# Altium footprint library 常用元件封装库.PcbLib: 1310 footprints (part 74 of 83)
Each footprint in its own frame and in the unit in brackets; x right, y up, seen from the top. Pads: shape width x height; smd on the part's side, far side on the other; paste and mask are expansions set on the pad; w line width, h text height; cw(c..) or ccw(c..) is an arc to the next point about the centre after c.
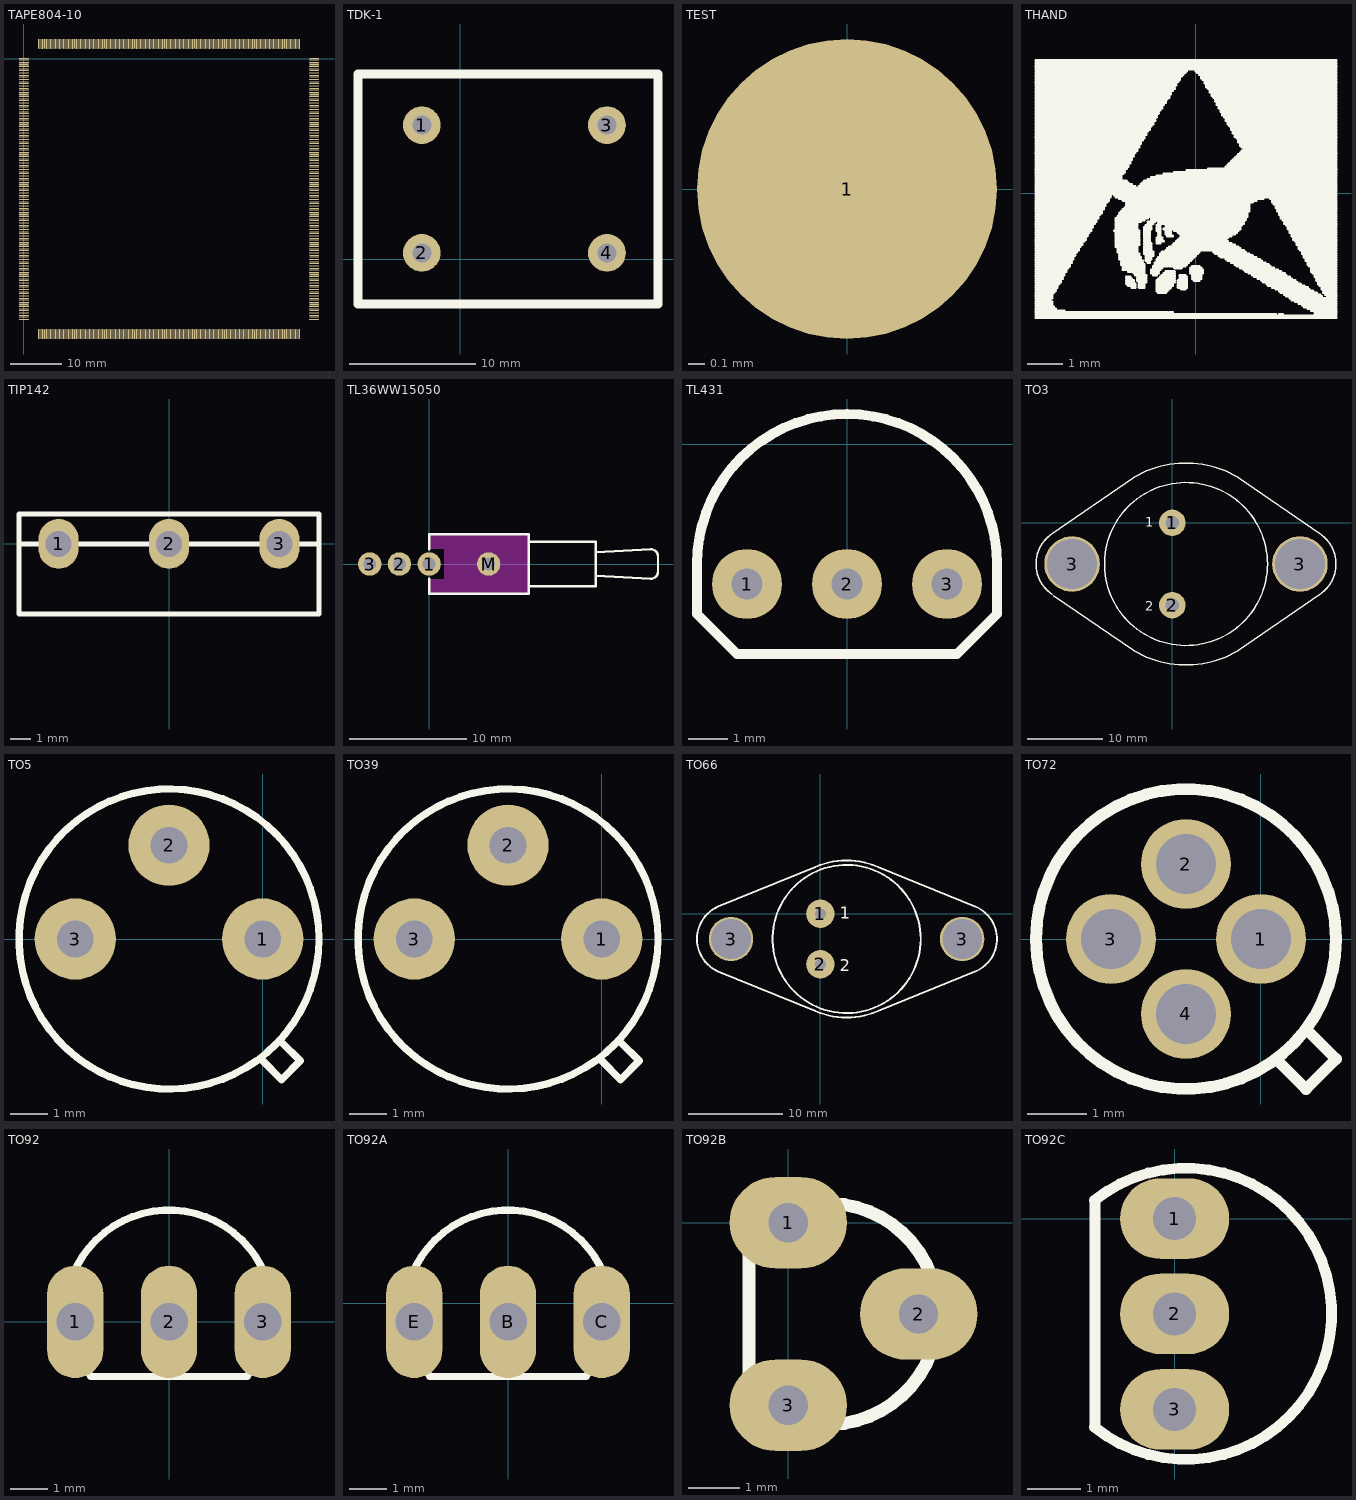
[diagram p73: the footprints below, top view; thin cyan lines are the x and y axes]

## TAPE804-10 [mil]
pads (804):
  oval 75x5 smd: 1(0,0) 2(0,-10) 3(0,-20) 4(0,-30) 5(0,-40) 6(0,-50) 7(0,-60) 8(0,-70) 9(0,-80) 10(0,-90) 11(0,-100) 12(0,-110) 13(0,-120) 14(0,-130) 15(0,-140) 16(0,-150) 17(0,-160) 18(0,-170) 19(0,-180) 20(0,-190) 21(0,-200) 22(0,-210) 23(0,-220) 24(0,-230) 25(0,-240) 26(0,-250) 27(0,-260) 28(0,-270) 29(0,-280) 30(0,-290) 31(0,-300) 32(0,-310) 33(0,-320) 34(0,-330) 35(0,-340) 36(0,-350) 37(0,-360) 38(0,-370) 39(0,-380) 40(0,-390) 41(0,-400) 42(0,-410) 43(0,-420) 44(0,-430) 45(0,-440) 46(0,-450) 47(0,-460) 48(0,-470) 49(0,-480) 50(0,-490) 51(0,-500) 52(0,-510) 53(0,-520) 54(0,-530) 55(0,-540) 56(0,-550) 57(0,-560) 58(0,-570) 59(0,-580) 60(0,-590) 61(0,-600) 62(0,-610) 63(0,-620) 64(0,-630) 65(0,-640) 66(0,-650) 67(0,-660) 68(0,-670) 69(0,-680) 70(0,-690) 71(0,-700) 72(0,-710) 73(0,-720) 74(0,-730) 75(0,-740) 76(0,-750) 77(0,-760) 78(0,-770) 79(0,-780) 80(0,-790) 81(0,-800) 82(0,-810) 83(0,-820) 84(0,-830) 85(0,-840) 86(0,-850) 87(0,-860) 88(0,-870) 89(0,-880) 90(0,-890) 91(0,-900) 92(0,-910) 93(0,-920) 94(0,-930) 95(0,-940) 96(0,-950) 97(0,-960) 98(0,-970) 99(0,-980) 100(0,-990) 101(0,-1000) 102(0,-1010) 103(0,-1020) 104(0,-1030) 105(0,-1040) 106(0,-1050) 107(0,-1060) 108(0,-1070) 109(0,-1080) 110(0,-1090) 111(0,-1100) 112(0,-1110) 113(0,-1120) 114(0,-1130) 115(0,-1140) 116(0,-1150) 117(0,-1160) 118(0,-1170) 119(0,-1180) 120(0,-1190) 121(0,-1200) 122(0,-1210) 123(0,-1220) 124(0,-1230) 125(0,-1240) 126(0,-1250) 127(0,-1260) 128(0,-1270) 129(0,-1280) 130(0,-1290) 131(0,-1300) 132(0,-1310) 133(0,-1320) 134(0,-1330) 135(0,-1340) 136(0,-1350) 137(0,-1360) 138(0,-1370) 139(0,-1380) 140(0,-1390) 141(0,-1400) 142(0,-1410) 143(0,-1420) 144(0,-1430) 145(0,-1440) 146(0,-1450) 147(0,-1460) 148(0,-1470) 149(0,-1480) 150(0,-1490) 151(0,-1500) 152(0,-1510) 153(0,-1520) 154(0,-1530) 155(0,-1540) 156(0,-1550) 157(0,-1560) 158(0,-1570) 159(0,-1580) 160(0,-1590) 161(0,-1600) 162(0,-1610) 163(0,-1620) 164(0,-1630) 165(0,-1640) 166(0,-1650) 167(0,-1660) 168(0,-1670) 169(0,-1680) 170(0,-1690) 171(0,-1700) 172(0,-1710) 173(0,-1720) 174(0,-1730) 175(0,-1740) 176(0,-1750) 177(0,-1760) 178(0,-1770) 179(0,-1780) 180(0,-1790) 181(0,-1800) 182(0,-1810) 183(0,-1820) 184(0,-1830) 185(0,-1840) 186(0,-1850) 187(0,-1860) 188(0,-1870) 189(0,-1880) 190(0,-1890) 191(0,-1900) 192(0,-1910) 193(0,-1920) 194(0,-1930) 195(0,-1940) 196(0,-1950) 197(0,-1960) 198(0,-1970) 199(0,-1980) 200(0,-1990) 201(0,-2000) 403(2225,-2000) 404(2225,-1990) 405(2225,-1980) 406(2225,-1970) 407(2225,-1960) 408(2225,-1950) 409(2225,-1940) 410(2225,-1930) 411(2225,-1920) 412(2225,-1910) 413(2225,-1900) 414(2225,-1890) 415(2225,-1880) 416(2225,-1870) 417(2225,-1860) 418(2225,-1850) 419(2225,-1840) 420(2225,-1830) 421(2225,-1820) 422(2225,-1810) 423(2225,-1800) 424(2225,-1790) 425(2225,-1780) 426(2225,-1770) 427(2225,-1760) 428(2225,-1750) 429(2225,-1740) 430(2225,-1730) 431(2225,-1720) 432(2225,-1710) 433(2225,-1700) 434(2225,-1690) 435(2225,-1680) 436(2225,-1670) 437(2225,-1660) 438(2225,-1650) 439(2225,-1640) 440(2225,-1630) 441(2225,-1620) 442(2225,-1610) 443(2225,-1600) 444(2225,-1590) 445(2225,-1580) 446(2225,-1570) 447(2225,-1560) 448(2225,-1550) 449(2225,-1540) 450(2225,-1530) 451(2225,-1520) 452(2225,-1510) 453(2225,-1500) 454(2225,-1490) 455(2225,-1480) 456(2225,-1470) 457(2225,-1460) 458(2225,-1450) 459(2225,-1440) 460(2225,-1430) 461(2225,-1420) 462(2225,-1410) 463(2225,-1400) 464(2225,-1390) 465(2225,-1380) 466(2225,-1370) 467(2225,-1360) 468(2225,-1350) 469(2225,-1340) 470(2225,-1330) 471(2225,-1320) 472(2225,-1310) 473(2225,-1300) 474(2225,-1290) 475(2225,-1280) 476(2225,-1270) 477(2225,-1260) 478(2225,-1250) 479(2225,-1240) 480(2225,-1230) 481(2225,-1220) 482(2225,-1210) 483(2225,-1200) 484(2225,-1190) 485(2225,-1180) 486(2225,-1170) 487(2225,-1160) 488(2225,-1150) 489(2225,-1140) 490(2225,-1130) 491(2225,-1120) 492(2225,-1110) 493(2225,-1100) 494(2225,-1090) 495(2225,-1080) 496(2225,-1070) 497(2225,-1060) 498(2225,-1050) 499(2225,-1040) 500(2225,-1030) 501(2225,-1020) 502(2225,-1010) 503(2225,-1000) 504(2225,-990) 505(2225,-980) 506(2225,-970) 507(2225,-960) 508(2225,-950) 509(2225,-940) 510(2225,-930) 511(2225,-920) 512(2225,-910) 513(2225,-900) 514(2225,-890) 515(2225,-880) 516(2225,-870) 517(2225,-860) 518(2225,-850) 519(2225,-840) 520(2225,-830) 521(2225,-820) 522(2225,-810) 523(2225,-800) 524(2225,-790) 525(2225,-780) 526(2225,-770) 527(2225,-760) 528(2225,-750) 529(2225,-740) 530(2225,-730) 531(2225,-720) 532(2225,-710) 533(2225,-700) 534(2225,-690) 535(2225,-680) 536(2225,-670) 537(2225,-660) 538(2225,-650) 539(2225,-640) 540(2225,-630) 541(2225,-620) 542(2225,-610) 543(2225,-600) 544(2225,-590) 545(2225,-580) 546(2225,-570) 547(2225,-560) 548(2225,-550) 549(2225,-540) 550(2225,-530) 551(2225,-520) 552(2225,-510) 553(2225,-500) 554(2225,-490) 555(2225,-480) 556(2225,-470) 557(2225,-460) 558(2225,-450) 559(2225,-440) 560(2225,-430) 561(2225,-420) 562(2225,-410) 563(2225,-400) 564(2225,-390) 565(2225,-380) 566(2225,-370) 567(2225,-360) 568(2225,-350) 569(2225,-340) 570(2225,-330) 571(2225,-320) 572(2225,-310) 573(2225,-300) 574(2225,-290) 575(2225,-280) 576(2225,-270) 577(2225,-260) 578(2225,-250) 579(2225,-240) 580(2225,-230) 581(2225,-220) 582(2225,-210) 583(2225,-200) 584(2225,-190) 585(2225,-180) 586(2225,-170) 587(2225,-160) 588(2225,-150) 589(2225,-140) 590(2225,-130) 591(2225,-120) 592(2225,-110) 593(2225,-100) 594(2225,-90) 595(2225,-80) 596(2225,-70) 597(2225,-60) 598(2225,-50) 599(2225,-40) 600(2225,-30) 601(2225,-20) 602(2225,-10) 603(2225,0)
  oval 5x75 smd: 202(113,-2112) 203(123,-2112) 204(133,-2112) 205(143,-2112) 206(153,-2112) 207(163,-2112) 208(173,-2112) 209(183,-2112) 210(193,-2112) 211(203,-2112) 212(213,-2112) 213(223,-2112) 214(233,-2112) 215(243,-2112) 216(253,-2112) 217(263,-2112) 218(273,-2112) 219(283,-2112) 220(293,-2112) 221(303,-2112) 222(313,-2112) 223(323,-2112) 224(333,-2112) 225(343,-2112) 226(353,-2112) 227(363,-2112) 228(373,-2112) 229(383,-2112) 230(393,-2112) 231(403,-2112) 232(413,-2112) 233(423,-2112) 234(433,-2112) 235(443,-2112) 236(453,-2112) 237(463,-2112) 238(473,-2112) 239(483,-2112) 240(493,-2112) 241(503,-2112) 242(513,-2112) 243(523,-2112) 244(533,-2112) 245(543,-2112) 246(553,-2112) 247(563,-2112) 248(573,-2112) 249(583,-2112) 250(593,-2112) 251(603,-2112) 252(613,-2112) 253(623,-2112) 254(633,-2112) 255(643,-2112) 256(653,-2112) 257(663,-2112) 258(673,-2112) 259(683,-2112) 260(693,-2112) 261(703,-2112) 262(713,-2112) 263(723,-2112) 264(733,-2112) 265(743,-2112) 266(753,-2112) 267(763,-2112) 268(773,-2112) 269(783,-2112) 270(793,-2112) 271(803,-2112) 272(813,-2112) 273(823,-2112) 274(833,-2112) 275(843,-2112) 276(853,-2112) 277(863,-2112) 278(873,-2112) 279(883,-2112) 280(893,-2112) 281(903,-2112) 282(913,-2112) 283(923,-2112) 284(933,-2112) 285(943,-2112) 286(953,-2112) 287(963,-2112) 288(973,-2112) 289(983,-2112) 290(993,-2112) 291(1003,-2112) 292(1013,-2112) 293(1023,-2112) 294(1033,-2112) 295(1043,-2112) 296(1053,-2112) 297(1063,-2112) 298(1073,-2112) 299(1083,-2112) 300(1093,-2112) 301(1103,-2112) 302(1113,-2112) 303(1123,-2112) 304(1133,-2112) 305(1143,-2112) 306(1153,-2112) 307(1163,-2112) 308(1173,-2112) 309(1183,-2112) 310(1193,-2112) 311(1203,-2112) 312(1213,-2112) 313(1223,-2112) 314(1233,-2112) 315(1243,-2112) 316(1253,-2112) 317(1263,-2112) 318(1273,-2112) 319(1283,-2112) 320(1293,-2112) 321(1303,-2112) 322(1313,-2112) 323(1323,-2112) 324(1333,-2112) 325(1343,-2112) 326(1353,-2112) 327(1363,-2112) 328(1373,-2112) 329(1383,-2112) 330(1393,-2112) 331(1403,-2112) 332(1413,-2112) 333(1423,-2112) 334(1433,-2112) 335(1443,-2112) 336(1453,-2112) 337(1463,-2112) 338(1473,-2112) 339(1483,-2112) 340(1493,-2112) 341(1503,-2112) 342(1513,-2112) 343(1523,-2112) 344(1533,-2112) 345(1543,-2112) 346(1553,-2112) 347(1563,-2112) 348(1573,-2112) 349(1583,-2112) 350(1593,-2112) 351(1603,-2112) 352(1613,-2112) 353(1623,-2112) 354(1633,-2112) 355(1643,-2112) 356(1653,-2112) 357(1663,-2112) 358(1673,-2112) 359(1683,-2112) 360(1693,-2112) 361(1703,-2112) 362(1713,-2112) 363(1723,-2112) 364(1733,-2112) 365(1743,-2112) 366(1753,-2112) 367(1763,-2112) 368(1773,-2112) 369(1783,-2112) 370(1793,-2112) 371(1803,-2112) 372(1813,-2112) 373(1823,-2112) 374(1833,-2112) 375(1843,-2112) 376(1853,-2112) 377(1863,-2112) 378(1873,-2112) 379(1883,-2112) 380(1893,-2112) 381(1903,-2112) 382(1913,-2112) 383(1923,-2112) 384(1933,-2112) 385(1943,-2112) 386(1953,-2112) 387(1963,-2112) 388(1973,-2112) 389(1983,-2112) 390(1993,-2112) 391(2003,-2112) 392(2013,-2112) 393(2023,-2112) 394(2033,-2112) 395(2043,-2112) 396(2053,-2112) 397(2063,-2112) 398(2073,-2112) 399(2083,-2112) 400(2093,-2112) 401(2103,-2112) 402(2113,-2112) 604(2113,113) 605(2103,113) 606(2093,113) 607(2083,113) 608(2073,113) 609(2063,113) 610(2053,113) 611(2043,113) 612(2033,113) 613(2023,113) 614(2013,113) 615(2003,113) 616(1993,113) 617(1983,113) 618(1973,113) 619(1963,113) 620(1953,113) 621(1943,113) 622(1933,113) 623(1923,113) 624(1913,113) 625(1903,113) 626(1893,113) 627(1883,113) 628(1873,113) 629(1863,113) 630(1853,113) 631(1843,113) 632(1833,113) 633(1823,113) 634(1813,113) 635(1803,113) 636(1793,113) 637(1783,113) 638(1773,113) 639(1763,113) 640(1753,113) 641(1743,113) 642(1733,113) 643(1723,113) 644(1713,113) 645(1703,113) 646(1693,113) 647(1683,113) 648(1673,113) 649(1663,113) 650(1653,113) 651(1643,113) 652(1633,113) 653(1623,113) 654(1613,113) 655(1603,113) 656(1593,113) 657(1583,113) 658(1573,113) 659(1563,113) 660(1553,113) 661(1543,113) 662(1533,113) 663(1523,113) 664(1513,113) 665(1503,113) 666(1493,113) 667(1483,113) 668(1473,113) 669(1463,113) 670(1453,113) 671(1443,113) 672(1433,113) 673(1423,113) 674(1413,113) 675(1403,113) 676(1393,113) 677(1383,113) 678(1373,113) 679(1363,113) 680(1353,113) 681(1343,113) 682(1333,113) 683(1323,113) 684(1313,113) 685(1303,113) 686(1293,113) 687(1283,113) 688(1273,113) 689(1263,113) 690(1253,113) 691(1243,113) 692(1233,113) 693(1223,113) 694(1213,113) 695(1203,113) 696(1193,113) 697(1183,113) 698(1173,113) 699(1163,113) 700(1153,113) 701(1143,113) 702(1133,113) 703(1123,113) 704(1113,113) 705(1103,113) 706(1093,113) 707(1083,113) 708(1073,113) 709(1063,113) 710(1053,113) 711(1043,113) 712(1033,113) 713(1023,113) 714(1013,113) 715(1003,113) 716(993,113) 717(983,113) 718(973,113) 719(963,113) 720(953,113) 721(943,113) 722(933,113) 723(923,113) 724(913,113) 725(903,113) 726(893,113) 727(883,113) 728(873,113) 729(863,113) 730(853,113) 731(843,113) 732(833,113) 733(823,113) 734(813,113) 735(803,113) 736(793,113) 737(783,113) 738(773,113) 739(763,113) 740(753,113) 741(743,113) 742(733,113) 743(723,113) 744(713,113) 745(703,113) 746(693,113) 747(683,113) 748(673,113) 749(663,113) 750(653,113) 751(643,113) 752(633,113) 753(623,113) 754(613,113) 755(603,113) 756(593,113) 757(583,113) 758(573,113) 759(563,113) 760(553,113) 761(543,113) 762(533,113) 763(523,113) 764(513,113) 765(503,113) 766(493,113) 767(483,113) 768(473,113) 769(463,113) 770(453,113) 771(443,113) 772(433,113) 773(423,113) 774(413,113) 775(403,113) 776(393,113) 777(383,113) 778(373,113) 779(363,113) 780(353,113) 781(343,113) 782(333,113) 783(323,113) 784(313,113) 785(303,113) 786(293,113) 787(283,113) 788(273,113) 789(263,113) 790(253,113) 791(243,113) 792(233,113) 793(223,113) 794(213,113) 795(203,113) 796(193,113) 797(183,113) 798(173,113) 799(163,113) 800(153,113) 801(143,113) 802(133,113) 803(123,113) 804(113,113)

## TDK-1 [mm]
pads (4):
  round 3 hole 1.5: 1(-3.048,10.668) 2(-3.048,0.508) 3(11.684,10.668) 4(11.684,0.508)
Top Overlay:
  lines w0.7: -8.128,-3.556 -8.128,14.732 15.748,14.732 15.748,-3.556 -8.128,-3.556

## TEST [mil]
pads (1):
  round 70 smd: 1(0,0)

## THAND [mil]
Top Overlay:
  drawing of 472 lines, arcs and shapes, not listed

## TIP142 [mil]
pads (3):
  oval 79x98 hole 51: 1(-217,0) 2(0,0) 3(217,0)
Top Overlay:
  lines w10: -295,0 295,0 ; -295,-138 295,-138 295,59 -295,59 -295,-138

## TL36WW15050 [mm] "SPDT Subminiature Toggle Switch, Right Angle Mounting, Vertical Actuation"
pads (4):
  round 2 hole 1.1: 1(0,0) 2(-2.54,0) 3(-5.08,0) M(5.08,0)
Top Layer keep-out:
  region: 0,-1.27 0,-2.54 1.27,-2.54 1.27,-1.27
  region: 0,2.54 0,1.27 1.27,1.27 1.27,2.54
  region: 1.27,2.54 1.27,-2.54 8.509,-2.54 8.509,2.54
Top Overlay:
  lines w0.2: 0,-1.27 0,-2.54 8.509,-2.54 8.509,2.54 0,2.54 0,1.27 ; 8.509,-1.905 14.224,-1.905 14.224,1.905 8.509,1.905 ; 14.224,-1.016 18.923,-1.27 ccw(c18.923,-0.635) 19.558,-0.635 19.558,0.635 ccw(c18.923,0.635) 18.923,1.27 14.224,1.016

## TL431 [mil]
pads (3):
  round 70 hole 31.5: 1(-100,-140) 2(0,-140) 3(100,-140)
Top Overlay:
  lines w10: -150,-170 -110,-210 110,-210 150,-170 150,-120 ccw(c0,-120) -150,-120 -150,-170

## TO3 [mil]
pads (4):
  round 137.79 hole 70: 1(0,0) 2(0,-430)
  round 290 hole 262: 3(-523.5,-215) 3(666.5,-215)
Top Overlay:
  circle w7.87: c71.5,-215 r425.69
  lines w7.87: -628.5,-56.67 -203.5,235 ; -627.34,-373.9 cw(c-520.17,-215) -627.34,-56.1 ; -620.17,-381.67 -203.5,-665 ; -200.18,-667.16 ccw(c71.5,-215) 343.18,-667.16 ; -200.18,237.16 cw(c71.5,-215) 343.18,237.16 ; 346.5,-665 771.5,-373.33 ; 346.5,235 771.5,-56.67 ; 770.34,-373.9 ccw(c663.17,-215) 770.34,-56.1
  text "1" at -140,-20 h50
  text "2" at -140,-460 h50

## TO5 [mm]
pads (3):
  round 2.2 hole 1: 1(0,0) 2(-2.54,2.54) 3(-5.08,0)
Top Overlay:
  circle w0.2: c-2.54,0 r4.064
  lines w0.2: 0,-3.302 0.508,-3.81 1.016,-3.302 0.508,-2.794

## TO39 [mm]
pads (3):
  round 2.2 hole 1: 1(0,0) 2(-2.54,2.54) 3(-5.08,0)
Top Overlay:
  circle w0.2: c-2.54,0 r4.064
  lines w0.2: 0,-3.302 0.508,-3.81 1.016,-3.302 0.508,-2.794

## TO66 [mil]
pads (4):
  round 118.11 hole 45: 1(0,0) 2(0,-210)
  round 185 hole 165: 3(-372,-105) 3(590,-105)
Top Overlay:
  circle w7.87: c109,-105 r308.33
  lines w7.87: -426,-240 -21,-405 ; -425.99,-239.75 cw(c-366,-105) -425.99,29.75 ; -426,30 -21,195 ; -18.64,-405.7 ccw(c109,-105) 236.64,-405.7 ; -18.64,195.7 cw(c109,-105) 236.64,195.7 ; 239,-405 644,-240 ; 239,195 644,30 ; 643.63,-240.21 ccw(c589,-105) 643.63,30.21
  text "1" at 80,-20 h50
  text "2" at 80,-240 h50

## TO72 [mil]
pads (4):
  round 60 hole 40: 1(0,0) 2(-50,50) 3(-100,0) 4(-50,-50)
Top Overlay:
  circle w7.87: c-50,0 r100
  lines w7.87: 10,-80 30,-100 50,-80 30,-60

## TO92 [mil]
pads (3):
  oval 60x120 hole 40: 1(-100,0) 2(0,0) 3(100,0)
Top Overlay:
  lines w7.87: -102.76,49.85 cw(c0,8.33) 102.76,49.85 ; -89.08,-49.71 -83.33,-58.33 83.33,-58.33 89.08,-49.71

## TO92A [mil]
pads (3):
  oval 60x120 hole 40: B(0,-20) C(100,-20) E(-100,-20)
Top Overlay:
  lines w7.87: -102.76,29.85 cw(c0,-11.67) 102.76,29.85 ; -89.08,-69.71 -83.33,-78.33 83.33,-78.33 89.08,-69.71

## TO92B [mil]
pads (3):
  oval 90x70 hole 30: 1(0,0) 2(100,-70) 3(0,-140)
Top Overlay:
  lines w10: -30,-130 ccw(c30,-70) -30,-10 -30,-28.02 -30,-130

## TO92C [mm]
pads (3):
  oval 2.032x1.5 hole 0.8: 1(0,0) 2(0,-1.77) 3(0,-3.548)
Top Overlay:
  lines w0.2: -1.493,-3.876 ccw(c0.212,-1.77) -1.493,0.336 ; -1.482,-3.887 -1.482,0.347